# Altium footprint library En.PcbLib: 240 footprints (part 12 of 15)
Each footprint in its own frame and in the unit in brackets; x right, y up, seen from the top. Pads: shape width x height; smd on the part's side, far side on the other; paste and mask are expansions set on the pad; w line width, h text height; cw(c..) or ccw(c..) is an arc to the next point about the centre after c.
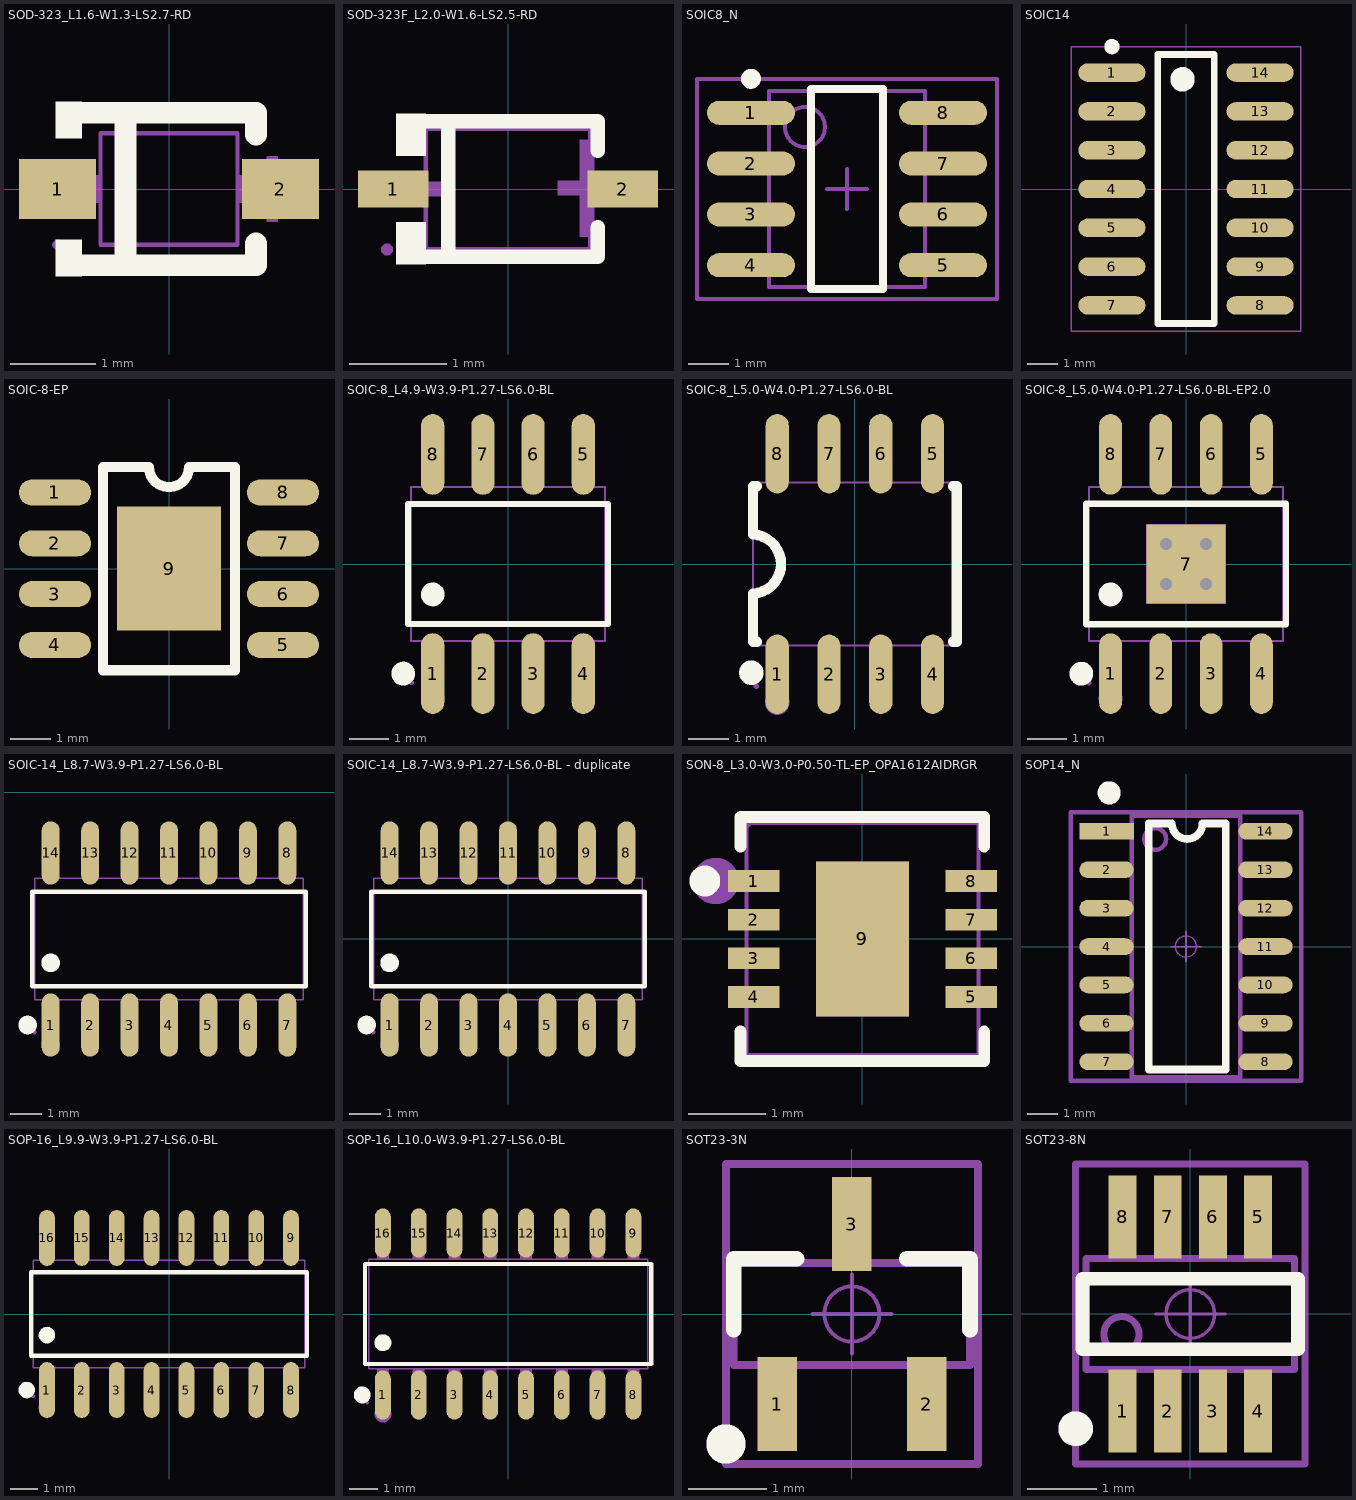
[diagram p11: the footprints below, top view; thin cyan lines are the x and y axes]

## SOD-323_L1.6-W1.3-LS2.7-RD [mm]
pads (2):
  rect 0.9x0.7 smd paste+0 mask+0.05: 1(-1.3,0) 2(1.3,0)
Top Overlay:
  region: -1.016,1.016 -1.016,0.593 -1.321,0.593 -1.321,1.016
  region: -1.016,-1.016 -1.016,-0.593 -1.321,-0.593 -1.321,-1.016
  lines w0.254: -1.143,-0.889 -0.728,-0.889 ; -1.143,0.889 -0.889,0.889 0.889,0.889 1.016,0.889 1.016,0.635 ; -0.889,-0.889 0.889,-0.889 ; -0.508,-0.889 -0.508,0.889 ; 0.763,-0.889 1.016,-0.889 1.016,-0.635
Mechanical 6:
  region: 0.826,0.064 1.587,0.064 1.587,-0.064 0.826,-0.064
  region: 1.143,-0.381 1.143,0.381 1.27,0.381 1.27,-0.381
  region: -1.651,0 -0.889,0 -0.889,-0.127 -1.651,-0.127
Mechanical 15:
  region: 1.025,-0.163 1.025,0.163 1.35,0.163 1.35,-0.163
  region: 0.79,-0.163 0.79,0.163 1.035,0.163 1.035,-0.163
  region: -1.35,-0.163 -1.35,0.163 -1.025,0.163 -1.025,-0.163
  region: -1.035,-0.163 -1.035,0.163 -0.79,0.163 -0.79,-0.163
  region: -1.24,-0.65 -1.241,-0.626 -1.276,-0.593 -1.324,-0.593 -1.359,-0.626 -1.36,-0.65 -1.359,-0.674 -1.324,-0.707 -1.276,-0.707 -1.241,-0.674
  lines w0.051: -0.8,-0.65 0.8,-0.65 0.8,0.65 -0.8,0.65 -0.8,-0.65
3D body "bzt52c27s_c22375300.step": height 0.45, standoff -0.5, extent -1.25,-0.625 1.25,0.625

## SOD-323F_L2.0-W1.6-LS2.5-RD [mm]
pads (2):
  rect 0.73x0.385 smd: 1(-1.185,0) 2(1.185,0)
Top Overlay:
  region: -0.85,-0.777 -0.85,-0.345 -1.155,-0.345 -1.155,-0.777
  region: -0.85,0.777 -0.85,0.345 -1.155,0.345 -1.155,0.777
  lines w0.152: -0.926,-0.701 0.926,-0.701 0.926,-0.396 ; -0.926,0.701 0.926,0.701 0.926,0.396 ; -0.617,-0.701 -0.617,0.701
Mechanical 6:
  region: 0.889,0.508 0.889,-0.492 0.739,-0.492 0.739,0.508
  region: 1.114,0.083 1.114,-0.067 0.514,-0.067 0.514,0.083
  region: -1.189,0.075 -1.189,-0.075 -0.589,-0.075 -0.589,0.075
Mechanical 15:
  region: 1.25,-0.163 1.25,0.163 0.85,0.163 0.85,-0.163
  region: -1.25,-0.163 -1.25,0.163 -0.85,0.163 -0.85,-0.163
  region: -1.19,-0.625 -1.19,-0.601 -1.225,-0.566 -1.274,-0.566 -1.309,-0.601 -1.31,-0.625 -1.309,-0.649 -1.274,-0.684 -1.225,-0.684 -1.19,-0.65
  lines w0.051: -0.85,-0.625 0.85,-0.625 0.85,0.625 -0.85,0.625 -0.85,-0.625
3D body "bat46wj,115.step": height 1.12, standoff -0.03, extent -1.353,-0.65 1.353,0.65

## SOIC8_N [mm]
pads (8):
  oval 2.2x0.6 smd: 1(3.442,-7.747) 2(3.442,-9.017) 3(3.442,-10.287) 4(3.442,-11.557) 5(8.242,-11.557) 6(8.242,-10.287) 7(8.242,-9.017) 8(8.242,-7.747)
Top Overlay:
  circle w0.25: c3.442,-6.897 r0.125
  lines w0.2: 4.942,-12.152 6.742,-12.152 6.742,-7.152 4.942,-7.152 4.942,-12.152
Mechanical 13:
  circle w0.1: c4.792,-8.102 r0.5
  lines w0.1: 3.892,-12.102 7.792,-12.102 7.792,-7.202 3.892,-7.202 3.892,-12.102
Mechanical 15:
  lines w0.1: 5.342,-9.652 6.342,-9.652 ; 5.842,-10.152 5.842,-9.152 ; 2.092,-12.402 9.592,-12.402 9.592,-6.902 2.092,-6.902 2.092,-12.402
3D body "User Library-SOIC-8-1 (1).SLDPRT": height 1.75, standoff 0, extent 2.842,-12.102 8.842,-7.202

## SOIC14 [mm]
pads (14):
  oval 2.2x0.6 smd: 1(-2.425,3.81) 2(-2.425,2.54) 3(-2.425,1.27) 4(-2.425,0) 5(-2.425,-1.27) 6(-2.425,-2.54) 7(-2.425,-3.81) 8(2.425,-3.81) 9(2.425,-2.54) 10(2.425,-1.27) 11(2.425,0) 12(2.425,1.27) 13(2.425,2.54) 14(2.425,3.81)
Top Overlay:
  circle w0.4: c-0.115,3.59 r0.2
  circle w0.25: c-2.425,4.66 r0.125
  lines w0.22: -0.925,-4.4 0.925,-4.4 0.925,4.4 -0.925,4.4 -0.925,-4.4
Mechanical 15:
  lines w0.05: -3.75,-4.65 3.75,-4.65 3.75,4.65 -3.75,4.65 -3.75,-4.65
3D body "SOIC14.STEP": height 1.75, standoff 0, extent -2.896,-4.237 2.904,4.293

## SOIC-8-EP [mm]
pads (9):
  oval 1.8x0.65 smd: 1(-2.85,1.905) 2(-2.85,0.635) 3(-2.85,-0.635) 4(-2.85,-1.905) 5(2.85,-1.905) 6(2.85,-0.635) 7(2.85,0.635) 8(2.85,1.905)
  rect 2.6x3.1 smd: 9(0,0)
Top Overlay:
  lines w0.254: 0.5,2.54 cw(c0,2.54) -0.5,2.54 -1.651,2.54 -1.651,-2.54 1.651,-2.54 1.651,2.54 0.508,2.54
3D body "ESOP8.STEP": height 1.53, standoff -0.01, extent -3.003,-2.5 3.003,2.5

## SOIC-8_L4.9-W3.9-P1.27-LS6.0-BL [mm]
pads (8):
  oval 0.588x2.045 smd mask+0.051: 1(-1.905,-2.772) 2(-0.635,-2.772) 3(0.635,-2.772) 4(1.905,-2.772) 5(1.905,2.772) 6(0.635,2.772) 7(-0.635,2.772) 8(-1.905,2.772)
Top Overlay:
  circle w0.3: c-2.652,-2.772 r0.15
  circle w0.3: c-1.905,-0.769 r0.15
  lines w0.152: -2.526,-1.521 2.526,-1.521 2.526,1.521 -2.526,1.521 -2.526,-1.521
Mechanical 6:
  circle w0.3: c-1.905,-3.4 r0.15
Mechanical 15:
  region: 1.695,2.175 1.695,1.94 2.115,1.94 2.115,2.175
  region: 1.695,3 1.695,2.165 2.115,2.165 2.115,3
  region: 0.425,2.175 0.425,1.94 0.845,1.94 0.845,2.175
  region: 0.425,3 0.425,2.165 0.845,2.165 0.845,3
  region: -0.845,2.175 -0.845,1.94 -0.425,1.94 -0.425,2.175
  region: -0.845,3 -0.845,2.165 -0.425,2.165 -0.425,3
  region: -2.115,2.175 -2.115,1.94 -1.695,1.94 -1.695,2.175
  region: -2.115,3 -2.115,2.165 -1.695,2.165 -1.695,3
  region: 1.695,-2.175 1.695,-1.94 2.115,-1.94 2.115,-2.175
  region: 1.695,-3 1.695,-2.165 2.115,-2.165 2.115,-3
  region: 0.425,-2.175 0.425,-1.94 0.845,-1.94 0.845,-2.175
  region: 0.425,-3 0.425,-2.165 0.845,-2.165 0.845,-3
  region: -0.845,-2.175 -0.845,-1.94 -0.425,-1.94 -0.425,-2.175
  region: -0.845,-3 -0.845,-2.165 -0.425,-2.165 -0.425,-3
  region: -2.115,-2.175 -2.115,-1.94 -1.695,-1.94 -1.695,-2.175
  region: -2.115,-3 -2.115,-2.165 -1.695,-2.165 -1.695,-3
  region: -2.39,-3 -2.39,-2.975 -2.425,-2.94 -2.475,-2.94 -2.51,-2.975 -2.51,-3 -2.51,-3.025 -2.475,-3.06 -2.425,-3.06 -2.39,-3.025 -2.39,-3
  lines w0.051: -2.45,-1.95 2.45,-1.95 2.45,1.95 -2.45,1.95 -2.45,-1.95
3D body "User Library-SOIC-8-1 (1).SLDPRT": height 1.75, standoff 0, extent -2.45,-3 2.45,3

## SOIC-8_L5.0-W4.0-P1.27-LS6.0-BL [mil]
pads (8):
  oval 22.38x76.78 smd: 1(-75,-106.5) 2(-25,-106.5) 3(25,-106.5) 4(75,-106.5) 5(75,106.5) 6(25,106.5) 7(-25,106.5) 8(-75,106.5)
Top Overlay:
  circle w11.81: c-100,-105 r5.91
  lines w10: -98.43,-28.61 ccw(c-99.99,0) -98.23,28.59 ; -98.42,-28.61 -98.42,-59.05 -98.42,-75 -94.83,-75 ; -98.42,28.59 -98.42,59.05 -98.42,75 -94.83,75 ; 94.83,-75 98.42,-75 98.42,-59.05 98.42,59.05 98.42,75 94.83,75
Mechanical 6:
  circle w11.81: c-75,-133.86 r5.91
Mechanical 15:
  region: -92.92,-118.11 -92.94,-117.15 -94.32,-115.8 -96.24,-115.8 -97.62,-117.15 -97.64,-118.11 -97.62,-119.07 -96.24,-120.42 -94.32,-120.42 -92.94,-119.07
  region: 66.93,76.38 66.93,85.63 83.07,85.63 83.07,76.38
  region: 66.93,85.24 66.93,118.11 83.07,118.11 83.07,85.24
  region: 16.93,76.38 16.93,85.63 33.07,85.63 33.07,76.38
  region: 16.93,85.24 16.93,118.11 33.07,118.11 33.07,85.24
  region: -33.07,76.38 -33.07,85.63 -16.93,85.63 -16.93,76.38
  region: -33.07,85.24 -33.07,118.11 -16.93,118.11 -16.93,85.24
  region: -83.07,76.38 -83.07,85.63 -66.93,85.63 -66.93,76.38
  region: -83.07,85.24 -83.07,118.11 -66.93,118.11 -66.93,85.24
  region: 66.93,-85.63 66.93,-76.38 83.07,-76.38 83.07,-85.63
  region: 66.93,-118.11 66.93,-85.24 83.07,-85.24 83.07,-118.11
  region: 16.93,-85.63 16.93,-76.38 33.07,-76.38 33.07,-85.63
  region: 16.93,-118.11 16.93,-85.24 33.07,-85.24 33.07,-118.11
  region: -33.07,-85.63 -33.07,-76.38 -16.93,-76.38 -16.93,-85.63
  region: -33.07,-118.11 -33.07,-85.24 -16.93,-85.24 -16.93,-118.11
  region: -83.07,-85.63 -83.07,-76.38 -66.93,-76.38 -66.93,-85.63
  region: -83.07,-118.11 -83.07,-85.24 -66.93,-85.24 -66.93,-118.11
  lines w2: -98.42,-78.74 -98.42,78.74 98.42,78.74 98.42,-78.74 -98.42,-78.74
3D body "User Library-SOIC-8-1 (1).SLDPRT": height 68.9, standoff 0, extent -96.46,-118.11 96.46,118.11

## SOIC-8_L5.0-W4.0-P1.27-LS6.0-BL-EP2.0 [mm]
pads (9):
  oval 0.574x2.038 smd: 1(-1.905,-2.769) 2(-0.635,-2.769) 3(0.635,-2.769) 4(1.905,-2.769) 5(1.905,2.769) 6(0.635,2.769) 7(-0.635,2.769) 8(-1.905,2.769)
  rect 2x2 smd: 7(0,0)
via 0.5,0.5 diameter 0.61 hole 0.305
via -0.5,0.5 diameter 0.61 hole 0.305
via -0.5,-0.5 diameter 0.61 hole 0.305
via 0.5,-0.5 diameter 0.61 hole 0.305
Top Overlay:
  circle w0.3: c-1.905,-0.769 r0.15
  circle w0.3: c-2.644,-2.769 r0.15
  lines w0.152: -2.526,-1.521 -2.526,1.521 2.526,1.521 2.526,-1.521 -2.526,-1.521
Mechanical 6:
  circle w0.3: c-1.905,-3.4 r0.15
Mechanical 15:
  region: -2.39,-3 -2.391,-2.976 -2.426,-2.941 -2.475,-2.941 -2.51,-2.975 -2.51,-3 -2.51,-3.024 -2.475,-3.059 -2.426,-3.059 -2.391,-3.024
  region: -2.11,-3 -2.11,-2.165 -1.7,-2.165 -1.7,-3
  region: -2.11,-2.175 -2.11,-1.94 -1.7,-1.94 -1.7,-2.175
  region: -0.84,-3 -0.84,-2.165 -0.43,-2.165 -0.43,-3
  region: -0.84,-2.175 -0.84,-1.94 -0.43,-1.94 -0.43,-2.175
  region: 0.43,-3 0.43,-2.165 0.84,-2.165 0.84,-3
  region: 0.43,-2.175 0.43,-1.94 0.84,-1.94 0.84,-2.175
  region: 1.7,-3 1.7,-2.165 2.11,-2.165 2.11,-3
  region: 1.7,-2.175 1.7,-1.94 2.11,-1.94 2.11,-2.175
  region: -2.11,3 -2.11,2.165 -1.7,2.165 -1.7,3
  region: -2.11,2.175 -2.11,1.94 -1.7,1.94 -1.7,2.175
  region: -0.84,3 -0.84,2.165 -0.43,2.165 -0.43,3
  region: -0.84,2.175 -0.84,1.94 -0.43,1.94 -0.43,2.175
  region: 0.43,3 0.43,2.165 0.84,2.165 0.84,3
  region: 0.43,2.175 0.43,1.94 0.84,1.94 0.84,2.175
  region: 1.7,3 1.7,2.165 2.11,2.165 2.11,3
  region: 1.7,2.175 1.7,1.94 2.11,1.94 2.11,2.175
  region: -1,-1 -1,1 1,1 1,-1
  lines w0.051: -2.45,-1.95 -2.45,1.95 2.45,1.95 2.45,-1.95 -2.45,-1.95
3D body "User Library-SOIC-8-1 (1).SLDPRT": height 1.75, standoff 0, extent -2.45,-3 2.45,3

## SOIC-14_L8.7-W3.9-P1.27-LS6.0-BL [mm]
pads (14):
  oval 0.574x2.038 smd: 1(46.483,-7.49) 2(47.753,-7.49) 3(49.023,-7.49) 4(50.293,-7.49) 5(51.563,-7.49) 6(52.833,-7.49) 7(54.103,-7.49) 8(54.103,-1.952) 9(52.833,-1.952) 10(51.563,-1.952) 11(50.293,-1.952) 12(49.023,-1.952) 13(47.753,-1.952) 14(46.483,-1.952)
Top Overlay:
  circle w0.3: c45.743,-7.49 r0.15
  circle w0.3: c46.483,-5.49 r0.15
  lines w0.152: 45.891,-6.242 54.694,-6.242 54.694,-3.199 45.891,-3.199 45.891,-6.242
Mechanical 6:
  circle w0.3: c46.483,-8.121 r0.15
Mechanical 15:
  drawing of 33 lines, arcs and shapes, not listed
3D body "SOIC14.STEP": height 1.75, standoff 0, extent 45.999,-7.722 54.529,-1.922

## SOIC-14_L8.7-W3.9-P1.27-LS6.0-BL - duplicate [mm]
pads (14):
  oval 0.574x2.038 smd: 1(-3.81,-2.769) 2(-2.54,-2.769) 3(-1.27,-2.769) 4(0,-2.769) 5(1.27,-2.769) 6(2.54,-2.769) 7(3.81,-2.769) 8(3.81,2.769) 9(2.54,2.769) 10(1.27,2.769) 11(0,2.769) 12(-1.27,2.769) 13(-2.54,2.769) 14(-3.81,2.769)
Top Overlay:
  circle w0.3: c-3.81,-0.769 r0.15
  circle w0.3: c-4.549,-2.769 r0.15
  lines w0.152: -4.401,-1.521 -4.401,1.521 4.401,1.521 4.401,-1.521 -4.401,-1.521
Mechanical 6:
  circle w0.3: c-3.81,-3.4 r0.15
Mechanical 15:
  drawing of 33 lines, arcs and shapes, not listed

## SON-8_L3.0-W3.0-P0.50-TL-EP_OPA1612AIDRGR [mm]
pads (9):
  rect 0.665x0.28 smd: 1(-1.407,0.75) 2(-1.407,0.25) 3(-1.407,-0.25) 4(-1.407,-0.75) 5(1.407,-0.75) 6(1.407,-0.25) 7(1.407,0.25) 8(1.407,0.75)
  rect 1.2x2 smd: 9(0,0)
Top Overlay:
  circle w0.2: c-2.04,0.75 r0.1
  lines w0.152: -1.576,-1.195 -1.576,-1.576 1.576,-1.576 1.576,-1.195 ; -1.576,1.195 -1.576,1.576 1.576,1.576 1.576,1.195
Mechanical 6:
  circle w0.3: c-1.9,0.75 r0.15
Mechanical 15:
  region: -0.6,1 0.6,1 0.6,-1 -0.6,-1
  region: -1.5,0.875 -1.1,0.875 -1.1,0.625 -1.5,0.625
  region: -1.5,0.375 -1.1,0.375 -1.1,0.125 -1.5,0.125
  region: -1.5,-0.125 -1.1,-0.125 -1.1,-0.375 -1.5,-0.375
  region: -1.5,-0.625 -1.1,-0.625 -1.1,-0.875 -1.5,-0.875
  region: 1.5,0.875 1.1,0.875 1.1,0.625 1.5,0.625
  region: 1.5,0.375 1.1,0.375 1.1,0.125 1.5,0.125
  region: 1.5,-0.125 1.1,-0.125 1.1,-0.375 1.5,-0.375
  region: 1.5,-0.625 1.1,-0.625 1.1,-0.875 1.5,-0.875
  region: -1.44,1.5 -1.44,1.524 -1.475,1.559 -1.524,1.559 -1.559,1.524 -1.56,1.5 -1.559,1.475 -1.524,1.441 -1.475,1.441 -1.44,1.475
  lines w0.051: -1.5,-1.5 -1.5,1.5 1.5,1.5 1.5,-1.5 -1.5,-1.5
3D body "ina826aidrgt.step": height 0.75, standoff 0, extent -1.5,-1.5 1.5,1.5

## SOP14_N [mm] "8.7*6.2*1.8mm（长宽高）"
height 9.4
pads (14):
  rect 1.8x0.55 smd: 1(-2.625,3.81)
  oval 1.8x0.55 smd: 2(-2.625,2.54) 3(-2.625,1.27) 4(-2.625,0) 5(-2.625,-1.27) 6(-2.625,-2.54) 7(-2.625,-3.81) 8(2.625,-3.81) 9(2.625,-2.54) 10(2.625,-1.27) 11(2.625,0) 12(2.625,1.27) 13(2.625,2.54) 14(2.625,3.81)
Top Overlay:
  circle w0.508: c-2.54,5.08 r0.127
  lines w0.254: -1.23,-4.064 -1.23,4.064 -0.468,4.064 ccw(c0.04,4.064) 0.04,3.556 ccw(c0.04,4.064) 0.548,4.064 1.31,4.064 1.31,-4.064 -1.23,-4.064
Mechanical 13:
  circle w0.15: c-1.016,3.556 r0.359
  lines w0.15: -1.8,-4.318 -1.8,4.318 1.8,4.318 1.8,-4.318 -1.8,-4.318
Mechanical 15:
  circle w0.05: c0,0 r0.35
  lines w0.05: -0.5,0 0.5,0 ; 0,-0.5 0,0.5
  lines w0.15: -3.81,-4.445 3.81,-4.445 3.81,4.445 -3.81,4.445 -3.81,-4.445
3D body "SOP14.STEP": height 1.9, standoff 0, extent -3.003,-4.35 3.003,4.35

## SOP-16_L9.9-W3.9-P1.27-LS6.0-BL [mm]
pads (16):
  oval 0.574x2.038 smd: 1(-4.445,-2.769) 2(-3.175,-2.769) 3(-1.905,-2.769) 4(-0.635,-2.769) 5(0.635,-2.769) 6(1.905,-2.769) 7(3.175,-2.769) 8(4.445,-2.769) 9(4.445,2.769) 10(3.175,2.769) 11(1.905,2.769) 12(0.635,2.769) 13(-0.635,2.769) 14(-1.905,2.769) 15(-3.175,2.769) 16(-4.445,2.769)
Top Overlay:
  circle w0.3: c-5.184,-2.769 r0.15
  circle w0.3: c-4.445,-0.769 r0.15
  lines w0.152: -5.026,-1.521 5.026,-1.521 5.026,1.521 -5.026,1.521 -5.026,-1.521
Mechanical 6:
  circle w0.3: c-4.445,-3.4 r0.15
Mechanical 15:
  drawing of 37 lines, arcs and shapes, not listed
3D body "cd4046bm_tr.step": height 1.56, standoff 0, extent -4.95,-3 4.95,3

## SOP-16_L10.0-W3.9-P1.27-LS6.0-BL [mm]
pads (16):
  oval 0.56x1.745 smd: 1(-4.445,-2.872) 2(-3.175,-2.872) 3(-1.905,-2.872) 4(-0.635,-2.872) 5(0.635,-2.872) 6(1.905,-2.872) 7(3.175,-2.872) 8(4.445,-2.872) 9(4.445,2.872) 10(3.175,2.872) 11(1.905,2.872) 12(0.635,2.872) 13(-0.635,2.872) 14(-1.905,2.872) 15(-3.175,2.872) 16(-4.445,2.872)
Top Overlay:
  circle w0.3: c-4.445,-1.019 r0.15
  circle w0.3: c-5.177,-2.872 r0.15
  lines w0.152: -5.076,-1.771 -5.076,1.771 5.076,1.771 5.076,-1.771 -5.076,-1.771
Mechanical 6:
  circle w0.3: c-4.445,-3.55 r0.15
Mechanical 15:
  drawing of 37 lines, arcs and shapes, not listed
3D body "cd4017bm(lx).step": height 1.7, standoff 0, extent -5,-3.053 5,3.053

## SOT23-3N [mm] "3x1.3x1mm(长宽高)"
height 1.1
pads (3):
  rect 0.5x1.2 smd: 1(-0.95,-1.143) 2(0.95,-1.143) 3(0,1.143)
Top Overlay:
  circle w0.25: c-1.6,-1.651 r0.125
  lines w0.2: -1.501,-0.2 -1.501,0.7 -0.701,0.7 ; 0.699,0.7 1.499,0.7 1.499,-0.2
Mechanical 13:
  lines w0.1: -1.5,-0.65 1.5,-0.65 1.5,0.65 -1.5,0.65 -1.5,-0.65
Mechanical 15:
  circle w0.05: c0,0 r0.35
  lines w0.05: -0.5,0 0.5,0 ; 0,-0.5 0,0.5
  lines w0.1: -1.6,-1.905 1.6,-1.905 1.6,1.905 -1.6,1.905 -1.6,-1.905
3D body "SOT23-3.STEP": height 1.05, standoff 0, extent -1.5,-1.2 1.5,1.2

## SOT23-8N [mm] "3x1.6x1.1mm(长宽高)"
height 1.45
pads (8):
  rect 0.4x1.2 smd: 1(-0.975,-1.397) 2(-0.325,-1.397) 3(0.325,-1.397) 4(0.975,-1.397) 5(0.975,1.397) 6(0.325,1.397) 7(-0.325,1.397) 8(-0.975,1.397)
Top Overlay:
  circle w0.25: c-1.651,-1.651 r0.125
  lines w0.2: -1.55,-0.508 -1.55,0.508 1.55,0.508 1.55,-0.508 -1.55,-0.508
Mechanical 13:
  circle w0.1: c-0.992,-0.292 r0.254
  lines w0.1: -1.5,-0.8 1.5,-0.8 1.5,0.8 -1.5,0.8 -1.5,-0.8
Mechanical 15:
  circle w0.05: c0,0 r0.35
  lines w0.05: -0.5,0 0.5,0 ; 0,-0.5 0,0.5
  lines w0.1: -1.651,-2.159 1.651,-2.159 1.651,2.159 -1.651,2.159 -1.651,-2.159
3D body "SOT23-8.STEP": height 1.15, standoff 0, extent -1.5,-1.403 1.5,1.403